# Altium footprint library My_Forecaster.PcbLib: 5 footprints
Each footprint in its own frame and in the unit in brackets; x right, y up, seen from the top. Pads: shape width x height; smd on the part's side, far side on the other; paste and mask are expansions set on the pad; w line width, h text height; cw(c..) or ccw(c..) is an arc to the next point about the centre after c.
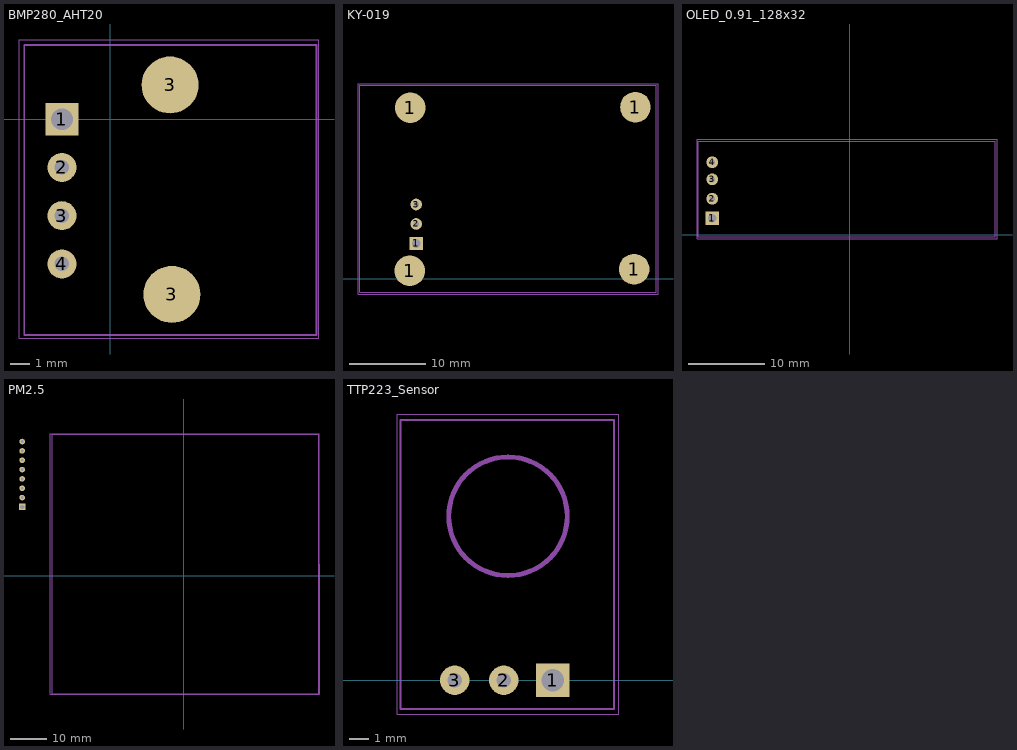
[diagram p0: the footprints below, top view; thin cyan lines are the x and y axes]

## BMP280_AHT20 [mm]
pads (6):
  rect 1.725x1.725 hole 1.15: 1(-2.54,0)
  round 1.524 hole 0.762: 2(-2.54,-2.54) 3(-2.54,-5.08) 4(-2.54,-7.62)
  round 3 smd: 3(3.15,1.8) 3(3.25,-9.225)
Mechanical 13:
  lines w0.1: -4.525,-11.35 -4.525,3.9 10.85,3.9 10.85,-11.35 -4.525,-11.35
Mechanical 15:
  lines w0.05: -4.8,-11.525 -4.8,4.175 10.99,4.175 10.99,-11.525 -4.8,-11.525
3D body "AHT20+BMP280.step": height 1.5, standoff -9.7, extent -4.325,-11.225 10.675,3.775

## KY-019 [mm] "Relay, High-Side"
pads (7):
  round 4 smd: 1(-43.225,1.025) 1(-43.15,22.35) 1(-13.9,1.25) 1(-13.725,22.425)
  rect 1.725x1.725 hole 1.15: 1(-42.378,4.614)
  round 1.524 hole 0.762: 2(-42.378,7.154) 3(-42.378,9.694)
Mechanical 13:
  lines w0.1: -49.774,-1.75 -49.774,25.272 -11,25.272 -11,-1.75 -49.774,-1.75
Mechanical 15:
  lines w0.05: -49.984,-2.025 -49.984,25.472 -10.775,25.472 -10.775,-2.025 -49.984,-2.025
3D body "CW-019.stp": height 16.95, standoff -3.8, extent -49.638,-1.55 -11.212,25.15

## OLED_0.91_128x32 [mm]
pads (4):
  rect 1.725x1.725 hole 1.15: 1(-18,2.18)
  round 1.524 hole 0.762: 2(-18,4.72) 3(-18,7.26) 4(-18,9.5)
Mechanical 13:
  lines w0.1: -19.815,-0.25 -19.815,12.25 19,12.25 19,-0.25 -19.815,-0.25
Mechanical 15:
  lines w0.05: -20,-0.5 -20,12.5 19.25,12.5 19.25,-0.5 -20,-0.5
3D body "OLED_0.91_128x32.stp": height 2.51, standoff -8.95, extent -19.602,0.015 18.698,12.115

## PM2.5 [mil]
pads (8):
  rect 67.91x67.91 hole 45.28: 1(-1733.07,739.76)
  round 60 hole 30: 2(-1733.07,839.76) 3(-1733.07,939.76) 4(-1733.07,1039.76) 5(-1733.07,1139.76) 6(-1733.07,1239.76) 7(-1733.07,1339.76) 8(-1733.07,1439.76)
Mechanical 13:
  lines w3.94: -1412.01,-1259.84 1437.01,-1259.84 1437.01,1515.75 -1412.01,1515.75 -1412.01,-1259.84
Mechanical 15:
  lines w1.97: -1430.31,-1269.68 1446.85,-1269.68 1446.85,1525.59 -1430.31,1525.59 -1430.31,-1269.68
3D body "NOVA PM SENSOR.STEP": height 828.74, standoff -137.8, extent -1397.64,-1250 1425.2,1505.91

## TTP223_Sensor [mil]
pads (3):
  rect 67.91x67.91 hole 45.28: 1(800,0)
  round 60 hole 30: 2(700,0) 3(600,0)
Mechanical 13:
  lines w3.94: 489.57,-59.06 489.57,531.5 925.2,531.5 925.2,-59.06 489.57,-59.06
Mechanical 15:
  circle w10: c708.66,334.65 r120.93
  lines w1.97: 482.28,-68.9 482.28,543.31 935.04,543.31 935.04,-68.9 482.28,-68.9
3D body "touch button TTP223.SLDPRT": height 39.37, standoff -39.37, extent 501.97,-49.21 915.35,521.65